# Altium footprint library Footprint.PcbLib: 55 footprints (part 4 of 4)
Each footprint in its own frame and in the unit in brackets; x right, y up, seen from the top. Pads: shape width x height; smd on the part's side, far side on the other; paste and mask are expansions set on the pad; w line width, h text height; cw(c..) or ccw(c..) is an arc to the next point about the centre after c.
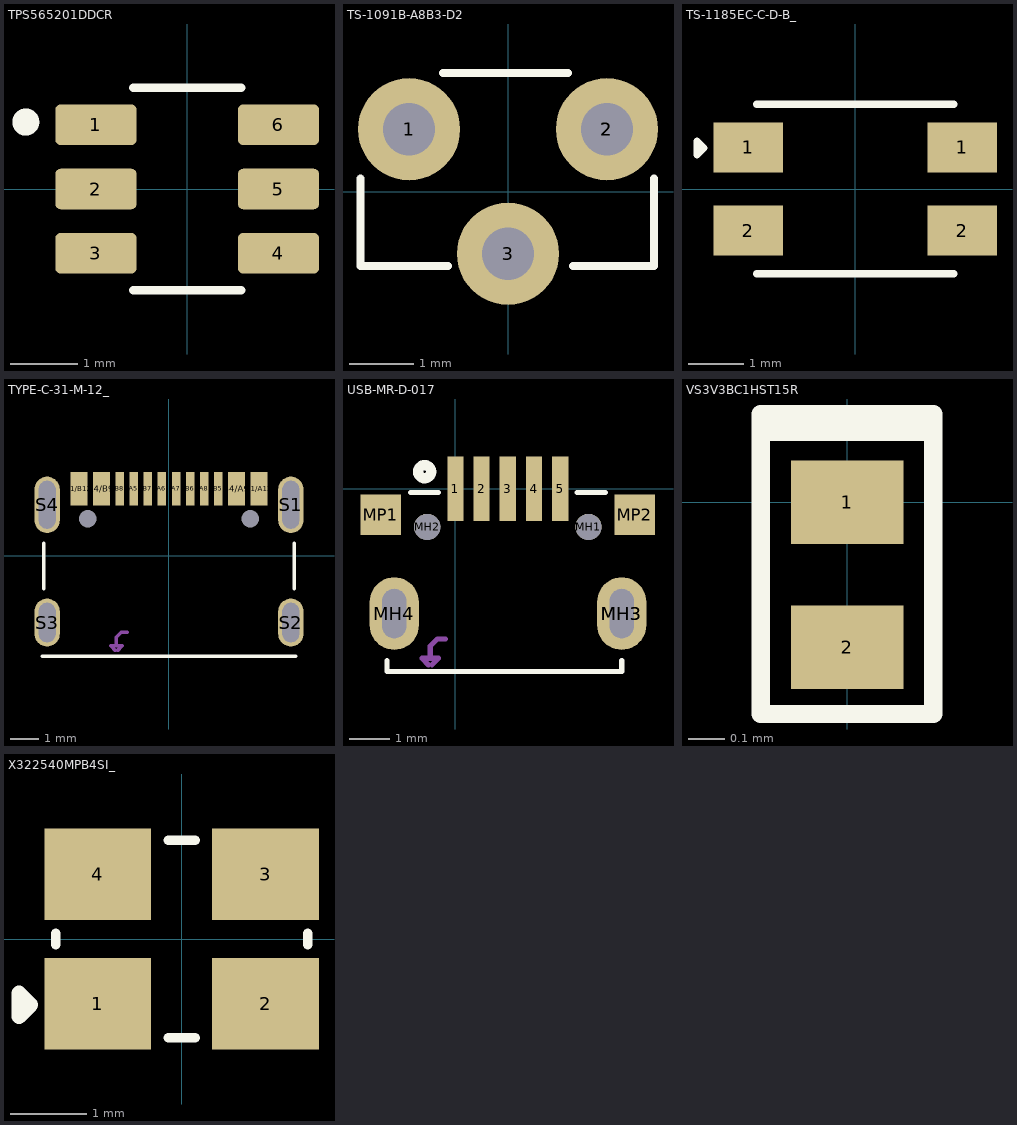
[diagram p3: the footprints below, top view; thin cyan lines are the x and y axes]

## TPS565201DDCR [mm]
pads (6):
  rrect25% 1.2x0.6 smd: 1(-1.35,0.95) 2(-1.35,0) 3(-1.35,-0.95) 4(1.35,-0.95) 5(1.35,0) 6(1.35,0.95)
Top Overlay:
  circle w0.2: c-2.388,0.991 r0.1
  lines w0.127: -0.8,-1.5 0.8,-1.5 ; -0.8,1.5 0.8,1.5
3D body "TPS565201DDCR.STEP": height 1.1, standoff 0, extent -1.4,-1.478 1.4,1.422

## TS-1091B-A8B3-D2 [mm]
pads (4):
  round 1.6 hole 0.82: 1(-1.55,0.975) 2(1.55,0.975) 2(1.55,0.975) 3(0,-0.975)
Top Overlay:
  lines w0.127: -2.311,0.203 -2.311,-1.168 -0.94,-1.168 ; -1.016,1.854 0.94,1.854 ; 1.016,-1.168 2.286,-1.168 2.286,0.203
3D body "TS-1091B-A8B3-D2.STEP": height 4.75, standoff -1.75, extent -2.275,-5.192 2.225,1.808

## TS-1185EC-C-D-B_ [mm]
pads (4):
  rect 1.25x0.9 smd: 1(-1.925,0.75) 1(1.925,0.75) 2(-1.925,-0.75) 2(1.925,-0.75)
Top Overlay:
  lines w0.127: -1.778,-1.524 1.778,-1.524 ; -1.778,1.524 1.778,1.524 ; -2.845,0.61 -2.718,0.737 -2.845,0.864 -2.845,0.61
3D body "ts-1185ec-c-d-b.stp": height 2, standoff 0, extent -2.325,-1.5 2.325,1.5

## TYPE-C-31-M-12_ [mm]
pads (18):
  rect 0.6x1.2 smd: A1/B12(-3.2,2.375) A4/B9(-2.4,2.375) B1/A12(3.2,2.375) B4/A9(2.4,2.375)
  rect 0.3x1.2 smd: A5(-1.25,2.375) A6(-0.25,2.375) A7(0.25,2.375) A8(1.25,2.375) B5(1.75,2.375) B6(0.75,2.375) B7(-0.75,2.375) B8(-1.75,2.375)
  round 0 hole 0.62 unplated: MH(-2.89,1.305) MH(2.89,1.305)
  oval 0.9x2 hole 0.6 slot 1.7 at 90 deg: S1(4.325,1.805) S4(-4.325,1.805)
  oval 0.9x1.7 hole 0.6 slot 1.4 at 90 deg: S2(4.325,-2.375) S3(-4.325,-2.375)
Top Overlay:
  lines w0.127: -4.495,-3.569 4.495,-3.569 ; -4.445,-1.181 -4.445,0.445 ; 4.445,-1.181 4.445,0.445
Mechanical 13:
  lines w0.127: -1.908,-3.365 -2.072,-3.202 -1.868,-3.202 ; -1.828,-3.365 -1.665,-3.202 -1.868,-3.202 ; -1.487,-2.72 -1.691,-2.72 -1.868,-2.897 -1.868,-3.202
  text "PCB Edge" at -1.338,-2.999 h0.8
3D body "TYPE-C-31-M-12--3DModel-STEP-56544.STEP": height 3.31, standoff -0.99, extent -4.47,-5.013 4.47,2.892

## USB-MR-D-017 [mm]
pads (12):
  rect 0.4x1.6 smd: 1(0,0) 2(0.65,0) 3(1.3,0) 4(1.95,0) 5(2.6,0)
  round 0.65 hole 0.65 unplated: MH1(3.3,-0.95) MH2(-0.7,-0.95)
  oval 1.22x1.8 hole 0.6 slot 1.22 at 90 deg: MH3(4.125,-3.1) MH3(4.125,-3.1) MH4(-1.515,-3.1)
  rect 1x1 smd: MP1(-1.85,-0.65) MP2(4.45,-0.65)
Top Overlay:
  circle w0.254: c-0.762,0.419 r0.163
  lines w0.127: -1.695,-4.26 -1.694,-4.541 4.127,-4.541 4.126,-4.263 ; -1.116,-0.098 -0.416,-0.098 ; 3.016,-0.098 3.716,-0.098
Mechanical 13:
  lines w0.127: -0.664,-4.372 -0.827,-4.209 -0.624,-4.209 ; -0.584,-4.372 -0.421,-4.209 -0.624,-4.209 ; -0.243,-3.726 -0.446,-3.726 -0.624,-3.904 -0.624,-4.209
  text "PCB Edge" at -0.094,-4.005 h0.8
3D body "usb-mr-d-017.stp": height 1.52, standoff -1.28, extent -2.405,-6.001 4.995,-0.301

## VS3V3BC1HST15R [mm]
pads (2):
  rect 0.31x0.23 smd mask+0.02: 1(0,0) 2(0,-0.4)
Top Overlay:
  lines w0.05: -0.238,0.193 0.238,0.193 ; -0.238,0.193 -0.238,-0.584 0.238,-0.584 0.238,0.193 ; -0.238,0.193 -0.238,0.193 ; -0.238,0.193 -0.238,0.243 ; -0.237,0.242 0.238,0.242 0.238,0.193 ; -0.238,0.243 -0.237,0.242

## X322540MPB4SI_ [mm]
pads (4):
  rect 1.4x1.2 smd: 1(-1.1,-0.85) 2(1.1,-0.85) 3(1.1,0.85) 4(-1.1,0.85)
Top Overlay:
  lines w0.127: -1.651,-0.076 -1.651,0.076 ; -0.178,-1.295 0.178,-1.295 ; -0.178,1.295 0.178,1.295 ; 1.651,-0.076 1.651,0.076
  lines w0.2: -2.134,-1.016 -2.134,-0.711 -1.981,-0.864 -2.134,-1.016
3D body "ABM8-24.000MHZ-R60-D-1-W-T.STEP": height 0.8, standoff 0, extent -1.6,-1.25 1.6,1.25